# Altium footprint library HARTING THD.PcbLib: 113 footprints (part 8 of 11) (continued)
## HARTING_09 67 025 4755 [mm] "Straight D-Sub 25 Female Contacts with Turned Soder Contacts and Hole" (continued)
Mechanical 14:
  circle w0.1: c23.5,0 r1.55
  circle w0.1: c-23.5,0 r1.55
  lines w0.1: -26.6,-4.75 ccw(c-25.1,-4.75) -25.1,-6.25 25.1,-6.25 ccw(c25.1,-4.75) 26.6,-4.75 26.6,4.75 ccw(c25.1,4.75) 25.1,6.25 -25.1,6.25 ccw(c-25.1,4.75) -26.6,4.75 -26.6,-4.75 ; -19.215,0.949 cw(c-16.655,1.4) -16.655,4 16.655,4 cw(c16.655,1.4) 19.216,0.949 18.722,-1.851 cw(c16.161,-1.4) 16.161,-4 -16.161,-4 cw(c-16.161,-1.4) -18.722,-1.851 -19.215,0.949 ; -18.772,1.027 cw(c-16.655,1.4) -16.655,3.55 16.655,3.55 cw(c16.655,1.4) 18.772,1.027 18.279,-1.773 cw(c16.161,-1.4) 16.161,-3.55 -16.161,-3.55 cw(c-16.161,-1.4) -18.279,-1.773 -18.772,1.027
  text "14" at 18.5,-5.2 h1.2
  text "13" at -21,4 h1.2
  text "25" at -20,-5.2 h1.2
  text "1" at 20,4 h1.2
3D body "HARTING_09 67 025 4755.stp": height 12.3, standoff -5.7, extent -26.6,-6.25 26.6,6.25

## HARTING_09 67 025 4755_a [mm] "PCB Edge Mounting Footprint For Straight D-Sub 25 Female Contacts with Turned Soder Contacts and Hole"
height 12.3
pads (25):
  rect 1.8x4.5 smd paste-2.26: 1(-16.56,0) 2(-13.8,0) 3(-11.04,0) 4(-8.28,0) 5(-5.52,0) 6(-2.76,0) 7(0,0) 8(2.76,0) 9(5.52,0) 10(8.28,0) 11(11.04,0) 12(13.8,0) 13(16.56,0)
  rect 1.8x4.5 smd far side paste-2.26: 14(-15.18,0) 15(-12.42,0) 16(-9.66,0) 17(-6.9,0) 18(-4.14,0) 19(-1.38,0) 20(1.38,0) 21(4.14,0) 22(6.9,0) 23(9.66,0) 24(12.42,0) 25(15.18,0)
Top Overlay:
  lines w0.2: -20.162,8.928 -20.162,5.428 ccw(c-19.666,5.424) -19.67,4.928 19.67,4.928 ccw(c19.666,5.424) 20.162,5.428 20.162,8.928 ; -19.717,4.928 -19.717,3.928 -16.86,3.928 ; -19.215,10.028 -19.215,15.478 cw(c-18.769,15.481) -18.772,15.928 ; -18.805,15.928 18.723,15.928 cw(c18.766,15.48) 19.216,15.478 19.216,10.028 ; -16.86,2.65 -16.86,4.928 ; -16.26,2.65 -16.26,4.928 ; -16.26,3.928 -14.1,3.928 ; -15.48,2.65 -15.48,2.928 ; -15.48,3.428 -15.48,3.928 ; -14.88,2.65 -14.88,2.928 ; -14.88,3.428 -14.88,3.928 ; -14.1,2.65 -14.1,4.928 ; -13.5,2.65 -13.5,4.928 ; -13.5,3.928 -11.34,3.928 ; -12.72,2.65 -12.72,2.928 ; -12.72,3.428 -12.72,3.928 ; -12.12,2.65 -12.12,2.928 ; -12.12,3.428 -12.12,3.928 ; -11.34,2.65 -11.34,4.928 ; -10.74,2.65 -10.74,4.928 ; -10.74,3.928 -8.58,3.928 ; -9.96,2.65 -9.96,2.928 ; -9.96,3.428 -9.96,3.928 ; -9.36,2.65 -9.36,2.928 ; -9.36,3.428 -9.36,3.928 ; -8.58,2.65 -8.58,4.928 ; -7.98,2.65 -7.98,4.928 ; -7.98,3.928 -5.82,3.928 ; -7.2,2.65 -7.2,2.928 ; -7.2,3.428 -7.2,3.928 ; -6.6,2.65 -6.6,2.928 ; -6.6,3.428 -6.6,3.928 ; -5.82,2.65 -5.82,4.928 ; -5.22,2.65 -5.22,4.928 ; -5.22,3.928 -3.06,3.928 ; -4.44,2.65 -4.44,2.928 ; -4.44,3.428 -4.44,3.928 ; -3.84,2.65 -3.84,2.928 ; -3.84,3.428 -3.84,3.928 ; -3.06,2.65 -3.06,4.928 ; -2.46,2.65 -2.46,4.928 ; -2.46,3.928 -0.3,3.928 ; -1.68,2.65 -1.68,2.928 ; -1.68,3.428 -1.68,3.928 ; -1.08,2.65 -1.08,2.928 ; -1.08,3.428 -1.08,3.928 ; -0.3,2.65 -0.3,4.928 ; 0.3,2.65 0.3,4.928 ; 0.3,3.928 2.46,3.928 ; 1.08,2.65 1.08,2.928 ; 1.08,3.428 1.08,3.928 ; 1.68,2.65 1.68,2.928 ; 1.68,3.428 1.68,3.928 ; 2.46,2.65 2.46,4.928 ; 3.06,2.65 3.06,4.928 ; 3.06,3.928 5.22,3.928 ; 3.84,2.65 3.84,2.928 ; 3.84,3.428 3.84,3.928 ; 4.44,2.65 4.44,2.928 ; 4.44,3.428 4.44,3.928 ; 5.22,2.65 5.22,4.928 ; 5.82,2.65 5.82,4.928 ; 5.82,3.928 7.98,3.928 ; 6.6,2.65 6.6,2.928 ; 6.6,3.428 6.6,3.928 ; 7.2,2.65 7.2,2.928 ; 7.2,3.428 7.2,3.928 ; 7.98,2.65 7.98,4.928 ; 8.58,2.65 8.58,4.928 ; 8.58,3.928 10.74,3.928 ; 9.36,2.65 9.36,2.928 ; 9.36,3.428 9.36,3.928 ; 9.96,2.65 9.96,2.928 ; 9.96,3.428 9.96,3.928 ; 10.74,2.65 10.74,4.928 ; 11.34,2.65 11.34,4.928 ; 11.34,3.928 13.5,3.928 ; 12.12,2.65 12.12,2.928 ; 12.12,3.428 12.12,3.928 ; 12.72,2.65 12.72,2.928 ; 12.72,3.428 12.72,3.928 ; 13.5,2.65 13.5,4.928 ; 14.1,2.65 14.1,4.928 ; 14.1,3.928 16.26,3.928 ; 14.88,2.65 14.88,2.928 ; 14.88,3.428 14.88,3.928 ; 15.48,2.65 15.48,2.928 ; 15.48,3.428 15.48,3.928 ; 16.26,2.65 16.26,4.928 ; 16.86,2.65 16.86,4.928 ; 16.86,3.928 19.717,3.928 19.717,4.928 ; -26.6,10.028 -26.575,8.928 26.594,8.928 26.594,10.028 -26.6,10.028
  text "13" at 18.07,-2.3 h1.2
  text "1" at -18.47,-2.2 h1.2
Bottom Overlay:
  lines w0.2: -20.162,8.928 -20.162,5.428 ccw(c-19.666,5.424) -19.67,4.928 19.67,4.928 ccw(c19.666,5.424) 20.162,5.428 20.162,8.928 ; -19.717,4.928 -19.717,3.928 -15.48,3.928 ; -19.215,10.028 -19.215,15.478 cw(c-18.769,15.481) -18.772,15.928 ; -18.805,15.928 18.723,15.928 cw(c18.766,15.48) 19.216,15.478 19.216,10.028 ; -15.48,2.65 -15.48,4.928 ; -14.88,2.65 -14.88,4.928 ; -14.88,3.928 -12.72,3.928 ; -14.1,2.65 -14.1,2.928 ; -14.1,3.428 -14.1,3.928 ; -13.5,2.65 -13.5,2.928 ; -13.5,3.428 -13.5,3.928 ; -12.72,2.65 -12.72,4.928 ; -12.12,2.65 -12.12,4.928 ; -12.12,3.928 -9.96,3.928 ; -11.34,2.65 -11.34,2.928 ; -11.34,3.428 -11.34,3.928 ; -10.74,2.65 -10.74,2.928 ; -10.74,3.428 -10.74,3.928 ; -9.96,2.65 -9.96,4.928 ; -9.36,2.65 -9.36,4.928 ; -9.36,3.928 -7.2,3.928 ; -8.58,2.65 -8.58,2.928 ; -8.58,3.428 -8.58,3.928 ; -7.98,2.65 -7.98,2.928 ; -7.98,3.428 -7.98,3.928 ; -7.2,2.65 -7.2,4.928 ; -6.6,2.65 -6.6,4.928 ; -6.6,3.928 -4.44,3.928 ; -5.82,2.65 -5.82,2.928 ; -5.82,3.428 -5.82,3.928 ; -5.22,2.65 -5.22,2.928 ; -5.22,3.428 -5.22,3.928 ; -4.44,2.65 -4.44,4.928 ; -3.84,2.65 -3.84,4.928 ; -3.84,3.928 -1.68,3.928 ; -3.06,2.65 -3.06,2.928 ; -3.06,3.428 -3.06,3.928 ; -2.46,2.65 -2.46,2.928 ; -2.46,3.428 -2.46,3.928 ; -1.68,2.65 -1.68,4.928 ; -1.08,2.65 -1.08,4.928 ; -1.08,3.928 1.08,3.928 ; -0.3,2.65 -0.3,2.928 ; -0.3,3.428 -0.3,3.928 ; 0.3,2.65 0.3,2.928 ; 0.3,3.428 0.3,3.928 ; 1.08,2.65 1.08,4.928 ; 1.68,2.65 1.68,4.928 ; 1.68,3.928 3.84,3.928 ; 2.46,2.65 2.46,2.928 ; 2.46,3.428 2.46,3.928 ; 3.06,2.65 3.06,2.928 ; 3.06,3.428 3.06,3.928 ; 3.84,2.65 3.84,4.928 ; 4.44,2.65 4.44,4.928 ; 4.44,3.928 6.6,3.928 ; 5.22,2.65 5.22,2.928 ; 5.22,3.428 5.22,3.928 ; 5.82,2.65 5.82,2.928 ; 5.82,3.428 5.82,3.928 ; 6.6,2.65 6.6,4.928 ; 7.2,2.65 7.2,4.928 ; 7.2,3.928 9.36,3.928 ; 7.98,2.65 7.98,2.928 ; 7.98,3.428 7.98,3.928 ; 8.58,2.65 8.58,2.928 ; 8.58,3.428 8.58,3.928 ; 9.36,2.65 9.36,4.928 ; 9.96,2.65 9.96,4.928 ; 9.96,3.928 12.12,3.928 ; 10.74,2.65 10.74,2.928 ; 10.74,3.428 10.74,3.928 ; 11.34,2.65 11.34,2.928 ; 11.34,3.428 11.34,3.928 ; 12.12,2.65 12.12,4.928 ; 12.72,2.65 12.72,4.928 ; 12.72,3.928 14.88,3.928 ; 13.5,2.65 13.5,2.928 ; 13.5,3.428 13.5,3.928 ; 14.1,2.65 14.1,2.928 ; 14.1,3.428 14.1,3.928 ; 14.88,2.65 14.88,4.928 ; 15.48,2.65 15.48,4.928 ; 15.48,3.928 19.717,3.928 19.717,4.928 ; 16.26,2.65 16.26,2.928 ; 16.26,3.428 16.26,3.928 ; 16.86,2.65 16.86,2.928 ; 16.86,3.428 16.86,3.928 ; -26.6,10.028 -26.575,8.928 26.594,8.928 26.594,10.028 -26.6,10.028
  text "25" at 18.27,-2.2 h1.2
  text "14" at -16.57,-2.2 h1.2
Mechanical 8:
  lines w0.1: -24,9.478 -23.5,9.478 ; -23.5,8.978 -23.5,9.478 ; -23.5,9.978 -23.5,9.478 ; -23,9.478 -23.5,9.478 ; -17.06,0 -16.56,0 ; -16.56,-0.5 -16.56,0 ; -16.56,0.5 -16.56,0 ; -16.06,0 -16.56,0 ; -15.68,0 -15.18,0 ; -15.18,-0.5 -15.18,0 ; -15.18,0.5 -15.18,0 ; -14.68,0 -15.18,0 ; -14.3,0 -13.8,0 ; -13.8,-0.5 -13.8,0 ; -13.8,0.5 -13.8,0 ; -13.3,0 -13.8,0 ; -12.92,0 -12.42,0 ; -12.42,-0.5 -12.42,0 ; -12.42,0.5 -12.42,0 ; -11.92,0 -12.42,0 ; -11.54,0 -11.04,0 ; -11.04,-0.5 -11.04,0 ; -11.04,0.5 -11.04,0 ; -10.54,0 -11.04,0 ; -10.16,0 -9.66,0 ; -9.66,-0.5 -9.66,0 ; -9.66,0.5 -9.66,0 ; -9.16,0 -9.66,0 ; -8.78,0 -8.28,0 ; -8.28,-0.5 -8.28,0 ; -8.28,0.5 -8.28,0 ; -7.78,0 -8.28,0 ; -7.4,0 -6.9,0 ; -6.9,-0.5 -6.9,0 ; -6.9,0.5 -6.9,0 ; -6.4,0 -6.9,0 ; -6.02,0 -5.52,0 ; -5.52,-0.5 -5.52,0 ; -5.52,0.5 -5.52,0 ; -5.02,0 -5.52,0 ; -4.64,0 -4.14,0 ; -4.14,-0.5 -4.14,0 ; -4.14,0.5 -4.14,0 ; -3.64,0 -4.14,0 ; -3.26,0 -2.76,0 ; -2.76,-0.5 -2.76,0 ; -2.76,0.5 -2.76,0 ; -2.26,0 -2.76,0 ; -1.88,0 -1.38,0 ; -1.38,-0.5 -1.38,0 ; -1.38,0.5 -1.38,0 ; -0.88,0 -1.38,0 ; -0.5,0 0,0 ; 0,-0.5 0,0 ; 0,0.5 0,0 ; 0.5,0 0,0 ; 0.88,0 1.38,0 ; 1.38,-0.5 1.38,0 ; 1.38,0.5 1.38,0 ; 1.88,0 1.38,0 ; 2.26,0 2.76,0 ; 2.76,-0.5 2.76,0 ; 2.76,0.5 2.76,0 ; 3.26,0 2.76,0 ; 3.64,0 4.14,0 ; 4.14,-0.5 4.14,0 ; 4.14,0.5 4.14,0 ; 4.64,0 4.14,0 ; 5.02,0 5.52,0 ; 5.52,-0.5 5.52,0 ; 5.52,0.5 5.52,0 ; 6.02,0 5.52,0 ; 6.4,0 6.9,0 ; 6.9,-0.5 6.9,0 ; 6.9,0.5 6.9,0 ; 7.4,0 6.9,0 ; 7.78,0 8.28,0 ; 8.28,-0.5 8.28,0 ; 8.28,0.5 8.28,0 ; 8.78,0 8.28,0 ; 9.16,0 9.66,0 ; 9.66,-0.5 9.66,0 ; 9.66,0.5 9.66,0 ; 10.16,0 9.66,0 ; 10.54,0 11.04,0 ; 11.04,-0.5 11.04,0 ; 11.04,0.5 11.04,0 ; 11.54,0 11.04,0 ; 11.92,0 12.42,0 ; 12.42,-0.5 12.42,0 ; 12.42,0.5 12.42,0 ; 12.92,0 12.42,0 ; 13.3,0 13.8,0 ; 13.8,-0.5 13.8,0 ; 13.8,0.5 13.8,0 ; 14.3,0 13.8,0 ; 14.68,0 15.18,0 ; 15.18,-0.5 15.18,0 ; 15.18,0.5 15.18,0 ; 15.68,0 15.18,0 ; 16.06,0 16.56,0 ; 16.56,-0.5 16.56,0 ; 16.56,0.5 16.56,0 ; 17.06,0 16.56,0 ; 23,9.478 23.5,9.478 ; 23.5,8.978 23.5,9.478 ; 23.5,9.978 23.5,9.478 ; 24,9.478 23.5,9.478
Mechanical 14:
  drawing of 250 lines, arcs and shapes, not listed
  text "13" at 18.07,-2.3 h1.2
  text "1" at -18.47,-2.2 h1.2
3D body "HARTING_09 67 025 4755_a.stp": height 5.45, standoff -7.05, extent -26.6,-2.072 26.6,15.928

## HARTING_09 67 025 5655 [mm] "Straight D-Sub 25 Male Contacts with Turned Soder Contacts and Hole"
height 12.3
pads (27):
  round 1.7 hole 1: 1(-16.56,1.42) 2(-13.8,1.42) 3(-11.04,1.42) 4(-8.28,1.42) 5(-5.52,1.42) 6(-2.76,1.42) 7(0,1.42) 8(2.76,1.42) 9(5.52,1.42) 10(8.28,1.42) 11(11.04,1.42) 12(13.8,1.42) 13(16.56,1.42) 14(-15.18,-1.42) 15(-12.42,-1.42) 16(-9.66,-1.42) 17(-6.9,-1.42) 18(-4.14,-1.42) 19(-1.38,-1.42) 20(1.38,-1.42) 21(4.14,-1.42) 22(6.9,-1.42) 23(9.66,-1.42) 24(12.42,-1.42) 25(15.18,-1.42)
  round 5.5 hole 3.2: 26(23.5,0) 27(-23.5,0)
Top Overlay:
  circle w0.5: c-16.56,7.42 r0.25
  lines w0.2: -26.6,-4.75 ccw(c-25.1,-4.75) -25.1,-6.25 25.1,-6.25 ccw(c25.1,-4.75) 26.6,-4.75 26.6,4.75 ccw(c25.1,4.75) 25.1,6.25 -25.1,6.25 ccw(c-25.1,4.75) -26.6,4.75 -26.6,-4.75 ; -20.003,0.987 cw(c-16.95,1.525) -16.95,4.625 16.95,4.625 cw(c16.95,1.525) 20.003,0.987 19.465,-2.063 cw(c16.412,-1.525) 16.412,-4.625 -16.412,-4.625 cw(c-16.412,-1.525) -19.465,-2.063 -20.003,0.987 ; -19.511,1.074 cw(c-16.95,1.525) -16.95,4.125 16.95,4.125 cw(c16.95,1.525) 19.511,1.074 18.973,-1.976 cw(c16.412,-1.525) 16.412,-4.125 -16.412,-4.125 cw(c-16.412,-1.525) -18.973,-1.976 -19.511,1.074
  text "13" at 20.19,4.075 h1.2
  text "25" at 19.655,-5.2 h1.2
  text "1" at -21.12,4 h1.2
  text "14" at -21.86,-5.2 h1.2
Mechanical 8:
  lines w0.1: -24,0 -23.5,0 ; -23.5,-0.5 -23.5,0 ; -23.5,0.5 -23.5,0 ; -23,0 -23.5,0 ; -17.06,1.42 -16.56,1.42 ; -16.56,0.92 -16.56,1.42 ; -16.56,1.92 -16.56,1.42 ; -16.06,1.42 -16.56,1.42 ; -15.68,-1.42 -15.18,-1.42 ; -15.18,-1.92 -15.18,-1.42 ; -15.18,-0.92 -15.18,-1.42 ; -14.68,-1.42 -15.18,-1.42 ; -14.3,1.42 -13.8,1.42 ; -13.8,0.92 -13.8,1.42 ; -13.8,1.92 -13.8,1.42 ; -13.3,1.42 -13.8,1.42 ; -12.92,-1.42 -12.42,-1.42 ; -12.42,-1.92 -12.42,-1.42 ; -12.42,-0.92 -12.42,-1.42 ; -11.92,-1.42 -12.42,-1.42 ; -11.54,1.42 -11.04,1.42 ; -11.04,0.92 -11.04,1.42 ; -11.04,1.92 -11.04,1.42 ; -10.54,1.42 -11.04,1.42 ; -10.16,-1.42 -9.66,-1.42 ; -9.66,-1.92 -9.66,-1.42 ; -9.66,-0.92 -9.66,-1.42 ; -9.16,-1.42 -9.66,-1.42 ; -8.78,1.42 -8.28,1.42 ; -8.28,0.92 -8.28,1.42 ; -8.28,1.92 -8.28,1.42 ; -7.78,1.42 -8.28,1.42 ; -7.4,-1.42 -6.9,-1.42 ; -6.9,-1.92 -6.9,-1.42 ; -6.9,-0.92 -6.9,-1.42 ; -6.4,-1.42 -6.9,-1.42 ; -6.02,1.42 -5.52,1.42 ; -5.52,0.92 -5.52,1.42 ; -5.52,1.92 -5.52,1.42 ; -5.02,1.42 -5.52,1.42 ; -4.64,-1.42 -4.14,-1.42 ; -4.14,-1.92 -4.14,-1.42 ; -4.14,-0.92 -4.14,-1.42 ; -3.64,-1.42 -4.14,-1.42 ; -3.26,1.42 -2.76,1.42 ; -2.76,0.92 -2.76,1.42 ; -2.76,1.92 -2.76,1.42 ; -2.26,1.42 -2.76,1.42 ; -1.88,-1.42 -1.38,-1.42 ; -1.38,-1.92 -1.38,-1.42 ; -1.38,-0.92 -1.38,-1.42 ; -0.88,-1.42 -1.38,-1.42 ; -0.5,0 0,0 ; -0.5,1.42 0,1.42 ; 0,-0.5 0,0 ; 0,0.5 0,0 ; 0,0.92 0,1.42 ; 0,1.92 0,1.42 ; 0.5,0 0,0 ; 0.5,1.42 0,1.42 ; 0.88,-1.42 1.38,-1.42 ; 1.38,-1.92 1.38,-1.42 ; 1.38,-0.92 1.38,-1.42 ; 1.88,-1.42 1.38,-1.42 ; 2.26,1.42 2.76,1.42 ; 2.76,0.92 2.76,1.42 ; 2.76,1.92 2.76,1.42 ; 3.26,1.42 2.76,1.42 ; 3.64,-1.42 4.14,-1.42 ; 4.14,-1.92 4.14,-1.42 ; 4.14,-0.92 4.14,-1.42 ; 4.64,-1.42 4.14,-1.42 ; 5.02,1.42 5.52,1.42 ; 5.52,0.92 5.52,1.42 ; 5.52,1.92 5.52,1.42 ; 6.02,1.42 5.52,1.42 ; 6.4,-1.42 6.9,-1.42 ; 6.9,-1.92 6.9,-1.42 ; 6.9,-0.92 6.9,-1.42 ; 7.4,-1.42 6.9,-1.42 ; 7.78,1.42 8.28,1.42 ; 8.28,0.92 8.28,1.42 ; 8.28,1.92 8.28,1.42 ; 8.78,1.42 8.28,1.42 ; 9.16,-1.42 9.66,-1.42 ; 9.66,-1.92 9.66,-1.42 ; 9.66,-0.92 9.66,-1.42 ; 10.16,-1.42 9.66,-1.42 ; 10.54,1.42 11.04,1.42 ; 11.04,0.92 11.04,1.42 ; 11.04,1.92 11.04,1.42 ; 11.54,1.42 11.04,1.42 ; 11.92,-1.42 12.42,-1.42 ; 12.42,-1.92 12.42,-1.42 ; 12.42,-0.92 12.42,-1.42 ; 12.92,-1.42 12.42,-1.42 ; 13.3,1.42 13.8,1.42 ; 13.8,0.92 13.8,1.42 ; 13.8,1.92 13.8,1.42 ; 14.3,1.42 13.8,1.42 ; 14.68,-1.42 15.18,-1.42 ; 15.18,-1.92 15.18,-1.42 ; 15.18,-0.92 15.18,-1.42 ; 15.68,-1.42 15.18,-1.42 ; 16.06,1.42 16.56,1.42 ; 16.56,0.92 16.56,1.42 ; 16.56,1.92 16.56,1.42 ; 17.06,1.42 16.56,1.42 ; 23,0 23.5,0 ; 23.5,-0.5 23.5,0 ; 23.5,0.5 23.5,0 ; 24,0 23.5,0
Mechanical 14:
  circle w0.1: c-23.5,0 r1.55
  circle w0.1: c23.5,0 r1.55
  circle w0.1: c-16.56,1.42 r0.5
  circle w0.1: c-15.18,-1.42 r0.5
  circle w0.1: c-13.8,1.42 r0.5
  circle w0.1: c-12.42,-1.42 r0.5
  circle w0.1: c-11.04,1.42 r0.5
  circle w0.1: c-9.66,-1.42 r0.5
  circle w0.1: c-8.28,1.42 r0.5
  circle w0.1: c-6.9,-1.42 r0.5
  circle w0.1: c-5.52,1.42 r0.5
  circle w0.1: c-4.14,-1.42 r0.5
  circle w0.1: c-2.76,1.42 r0.5
  circle w0.1: c-1.38,-1.42 r0.5
  circle w0.1: c0,1.42 r0.5
  circle w0.1: c1.38,-1.42 r0.5
  circle w0.1: c2.76,1.42 r0.5
  circle w0.1: c4.14,-1.42 r0.5
  circle w0.1: c5.52,1.42 r0.5
  circle w0.1: c6.9,-1.42 r0.5
  circle w0.1: c8.28,1.42 r0.5
  circle w0.1: c9.66,-1.42 r0.5
  circle w0.1: c11.04,1.42 r0.5
  circle w0.1: c12.42,-1.42 r0.5
  circle w0.1: c13.8,1.42 r0.5
  circle w0.1: c15.18,-1.42 r0.5
  circle w0.1: c16.56,1.42 r0.5
  lines w0.1: -26.6,-4.75 ccw(c-25.1,-4.75) -25.1,-6.25 25.1,-6.25 ccw(c25.1,-4.75) 26.6,-4.75 26.6,4.75 ccw(c25.1,4.75) 25.1,6.25 -25.1,6.25 ccw(c-25.1,4.75) -26.6,4.75 -26.6,-4.75 ; -20.003,0.987 cw(c-16.95,1.525) -16.95,4.625 16.95,4.625 cw(c16.95,1.525) 20.003,0.987 19.465,-2.063 cw(c16.412,-1.525) 16.412,-4.625 -16.412,-4.625 cw(c-16.412,-1.525) -19.465,-2.063 -20.003,0.987 ; -19.511,1.074 cw(c-16.95,1.525) -16.95,4.125 16.95,4.125 cw(c16.95,1.525) 19.511,1.074 18.973,-1.976 cw(c16.412,-1.525) 16.412,-4.125 -16.412,-4.125 cw(c-16.412,-1.525) -18.973,-1.976 -19.511,1.074
  text "14" at -21.86,-5.2 h1.2
  text "1" at -21.12,4 h1.2
  text "25" at 19.655,-5.2 h1.2
  text "13" at 20.19,4.075 h1.2
3D body "HARTING_09 67 025 5655.stp": height 12.3, standoff -5.7, extent -26.6,-6.25 26.6,6.25

## HARTING_09 67 025 5655_a [mm] "PCB Edge Mounting Footprint For D-Sub 25 Male Contacts with Turned Soder Contacts and Hole"
height 12.3
pads (25):
  rect 1.8x4.5 smd paste-2.26: 1(16.56,0) 2(13.8,0) 3(11.04,0) 4(8.28,0) 5(5.52,0) 6(2.76,0) 7(0,0) 8(-2.76,0) 9(-5.52,0) 10(-8.28,0) 11(-11.04,0) 12(-13.8,0) 13(-16.56,0)
  rect 1.8x4.5 smd far side paste-2.26: 14(15.18,0) 15(12.42,0) 16(9.66,0) 17(6.9,0) 18(4.14,0) 19(1.38,0) 20(-1.38,0) 21(-4.14,0) 22(-6.9,0) 23(-9.66,0) 24(-12.42,0) 25(-15.18,0)
Top Overlay:
  lines w0.2: -20.162,8.928 -20.162,5.428 ccw(c-19.666,5.424) -19.67,4.928 19.67,4.928 ccw(c19.666,5.424) 20.162,5.428 20.162,8.928 ; -19.717,4.928 -19.717,3.928 -16.86,3.928 ; -19.215,10.028 -19.215,15.478 cw(c-18.769,15.481) -18.772,15.928 ; -18.805,15.928 18.723,15.928 cw(c18.766,15.48) 19.216,15.478 19.216,10.028 ; -16.86,2.65 -16.86,4.928 ; -16.26,2.65 -16.26,4.928 ; -16.26,3.928 -14.1,3.928 ; -15.48,2.65 -15.48,2.928 ; -15.48,3.428 -15.48,3.928 ; -14.88,2.65 -14.88,2.928 ; -14.88,3.428 -14.88,3.928 ; -14.1,2.65 -14.1,4.928 ; -13.5,2.65 -13.5,4.928 ; -13.5,3.928 -11.34,3.928 ; -12.72,2.65 -12.72,2.928 ; -12.72,3.428 -12.72,3.928 ; -12.12,2.65 -12.12,2.928 ; -12.12,3.428 -12.12,3.928 ; -11.34,2.65 -11.34,4.928 ; -10.74,2.65 -10.74,4.928 ; -10.74,3.928 -8.58,3.928 ; -9.96,2.65 -9.96,2.928 ; -9.96,3.428 -9.96,3.928 ; -9.36,2.65 -9.36,2.928 ; -9.36,3.428 -9.36,3.928 ; -8.58,2.65 -8.58,4.928 ; -7.98,2.65 -7.98,4.928 ; -7.98,3.928 -5.82,3.928 ; -7.2,2.65 -7.2,2.928 ; -7.2,3.428 -7.2,3.928 ; -6.6,2.65 -6.6,2.928 ; -6.6,3.428 -6.6,3.928 ; -5.82,2.65 -5.82,4.928 ; -5.22,2.65 -5.22,4.928 ; -5.22,3.928 -3.06,3.928 ; -4.44,2.65 -4.44,2.928 ; -4.44,3.428 -4.44,3.928 ; -3.84,2.65 -3.84,2.928 ; -3.84,3.428 -3.84,3.928 ; -3.06,2.65 -3.06,4.928 ; -2.46,2.65 -2.46,4.928 ; -2.46,3.928 -0.3,3.928 ; -1.68,2.65 -1.68,2.928 ; -1.68,3.428 -1.68,3.928 ; -1.08,2.65 -1.08,2.928 ; -1.08,3.428 -1.08,3.928 ; -0.3,2.65 -0.3,4.928 ; 0.3,2.65 0.3,4.928 ; 0.3,3.928 2.46,3.928 ; 1.08,2.65 1.08,2.928 ; 1.08,3.428 1.08,3.928 ; 1.68,2.65 1.68,2.928 ; 1.68,3.428 1.68,3.928 ; 2.46,2.65 2.46,4.928 ; 3.06,2.65 3.06,4.928 ; 3.06,3.928 5.22,3.928 ; 3.84,2.65 3.84,2.928 ; 3.84,3.428 3.84,3.928 ; 4.44,2.65 4.44,2.928 ; 4.44,3.428 4.44,3.928 ; 5.22,2.65 5.22,4.928 ; 5.82,2.65 5.82,4.928 ; 5.82,3.928 7.98,3.928 ; 6.6,2.65 6.6,2.928 ; 6.6,3.428 6.6,3.928 ; 7.2,2.65 7.2,2.928 ; 7.2,3.428 7.2,3.928 ; 7.98,2.65 7.98,4.928 ; 8.58,2.65 8.58,4.928 ; 8.58,3.928 10.74,3.928 ; 9.36,2.65 9.36,2.928 ; 9.36,3.428 9.36,3.928 ; 9.96,2.65 9.96,2.928 ; 9.96,3.428 9.96,3.928 ; 10.74,2.65 10.74,4.928 ; 11.34,2.65 11.34,4.928 ; 11.34,3.928 13.5,3.928 ; 12.12,2.65 12.12,2.928 ; 12.12,3.428 12.12,3.928 ; 12.72,2.65 12.72,2.928 ; 12.72,3.428 12.72,3.928 ; 13.5,2.65 13.5,4.928 ; 14.1,2.65 14.1,4.928 ; 14.1,3.928 16.26,3.928 ; 14.88,2.65 14.88,2.928 ; 14.88,3.428 14.88,3.928 ; 15.48,2.65 15.48,2.928 ; 15.48,3.428 15.48,3.928 ; 16.26,2.65 16.26,4.928 ; 16.86,2.65 16.86,4.928 ; 16.86,3.928 19.717,3.928 19.717,4.928 ; -26.6,10.028 26.594,10.028 26.594,8.928 -26.575,8.928 -26.6,10.028
  text "13" at -18.47,-2.2 h1.2
  text "1" at 18.07,-2.3 h1.2
Bottom Overlay:
  lines w0.2: -20.162,8.928 -20.162,5.428 ccw(c-19.666,5.424) -19.67,4.928 19.67,4.928 ccw(c19.666,5.424) 20.162,5.428 20.162,8.928 ; -19.717,4.928 -19.717,3.928 -15.48,3.928 ; -19.215,10.028 -19.215,15.478 cw(c-18.769,15.481) -18.772,15.928 ; -18.805,15.928 18.723,15.928 cw(c18.766,15.48) 19.216,15.478 19.216,10.028 ; -15.48,2.65 -15.48,4.928 ; -14.88,2.65 -14.88,4.928 ; -14.88,3.928 -12.72,3.928 ; -14.1,2.65 -14.1,2.928 ; -14.1,3.428 -14.1,3.928 ; -13.5,2.65 -13.5,2.928 ; -13.5,3.428 -13.5,3.928 ; -12.72,2.65 -12.72,4.928 ; -12.12,2.65 -12.12,4.928 ; -12.12,3.928 -9.96,3.928 ; -11.34,2.65 -11.34,2.928 ; -11.34,3.428 -11.34,3.928 ; -10.74,2.65 -10.74,2.928 ; -10.74,3.428 -10.74,3.928 ; -9.96,2.65 -9.96,4.928 ; -9.36,2.65 -9.36,4.928 ; -9.36,3.928 -7.2,3.928 ; -8.58,2.65 -8.58,2.928 ; -8.58,3.428 -8.58,3.928 ; -7.98,2.65 -7.98,2.928 ; -7.98,3.428 -7.98,3.928 ; -7.2,2.65 -7.2,4.928 ; -6.6,2.65 -6.6,4.928 ; -6.6,3.928 -4.44,3.928 ; -5.82,2.65 -5.82,2.928 ; -5.82,3.428 -5.82,3.928 ; -5.22,2.65 -5.22,2.928 ; -5.22,3.428 -5.22,3.928 ; -4.44,2.65 -4.44,4.928 ; -3.84,2.65 -3.84,4.928 ; -3.84,3.928 -1.68,3.928 ; -3.06,2.65 -3.06,2.928 ; -3.06,3.428 -3.06,3.928 ; -2.46,2.65 -2.46,2.928 ; -2.46,3.428 -2.46,3.928 ; -1.68,2.65 -1.68,4.928 ; -1.08,2.65 -1.08,4.928 ; -1.08,3.928 1.08,3.928 ; -0.3,2.65 -0.3,2.928 ; -0.3,3.428 -0.3,3.928 ; 0.3,2.65 0.3,2.928 ; 0.3,3.428 0.3,3.928 ; 1.08,2.65 1.08,4.928 ; 1.68,2.65 1.68,4.928 ; 1.68,3.928 3.84,3.928 ; 2.46,2.65 2.46,2.928 ; 2.46,3.428 2.46,3.928 ; 3.06,2.65 3.06,2.928 ; 3.06,3.428 3.06,3.928 ; 3.84,2.65 3.84,4.928 ; 4.44,2.65 4.44,4.928 ; 4.44,3.928 6.6,3.928 ; 5.22,2.65 5.22,2.928 ; 5.22,3.428 5.22,3.928 ; 5.82,2.65 5.82,2.928 ; 5.82,3.428 5.82,3.928 ; 6.6,2.65 6.6,4.928 ; 7.2,2.65 7.2,4.928 ; 7.2,3.928 9.36,3.928 ; 7.98,2.65 7.98,2.928 ; 7.98,3.428 7.98,3.928 ; 8.58,2.65 8.58,2.928 ; 8.58,3.428 8.58,3.928 ; 9.36,2.65 9.36,4.928 ; 9.96,2.65 9.96,4.928 ; 9.96,3.928 12.12,3.928 ; 10.74,2.65 10.74,2.928 ; 10.74,3.428 10.74,3.928 ; 11.34,2.65 11.34,2.928 ; 11.34,3.428 11.34,3.928 ; 12.12,2.65 12.12,4.928 ; 12.72,2.65 12.72,4.928 ; 12.72,3.928 14.88,3.928 ; 13.5,2.65 13.5,2.928 ; 13.5,3.428 13.5,3.928 ; 14.1,2.65 14.1,2.928 ; 14.1,3.428 14.1,3.928 ; 14.88,2.65 14.88,4.928 ; 15.48,2.65 15.48,4.928 ; 15.48,3.928 19.717,3.928 19.717,4.928 ; 16.26,2.65 16.26,2.928 ; 16.26,3.428 16.26,3.928 ; 16.86,2.65 16.86,2.928 ; 16.86,3.428 16.86,3.928 ; -26.6,10.028 26.594,10.028 26.594,8.928 -26.575,8.928 -26.6,10.028
  text "25" at -16.57,-2.2 h1.2
  text "14" at 18.27,-2.2 h1.2
Mechanical 8:
  lines w0.1: -24,9.478 -23.5,9.478 ; -23.5,8.978 -23.5,9.478 ; -23.5,9.978 -23.5,9.478 ; -23,9.478 -23.5,9.478 ; -17.06,0 -16.56,0 ; -16.56,-0.5 -16.56,0 ; -16.56,0.5 -16.56,0 ; -16.06,0 -16.56,0 ; -15.68,0 -15.18,0 ; -15.18,-0.5 -15.18,0 ; -15.18,0.5 -15.18,0 ; -14.68,0 -15.18,0 ; -14.3,0 -13.8,0 ; -13.8,-0.5 -13.8,0 ; -13.8,0.5 -13.8,0 ; -13.3,0 -13.8,0 ; -12.92,0 -12.42,0 ; -12.42,-0.5 -12.42,0 ; -12.42,0.5 -12.42,0 ; -11.92,0 -12.42,0 ; -11.54,0 -11.04,0 ; -11.04,-0.5 -11.04,0 ; -11.04,0.5 -11.04,0 ; -10.54,0 -11.04,0 ; -10.16,0 -9.66,0 ; -9.66,-0.5 -9.66,0 ; -9.66,0.5 -9.66,0 ; -9.16,0 -9.66,0 ; -8.78,0 -8.28,0 ; -8.28,-0.5 -8.28,0 ; -8.28,0.5 -8.28,0 ; -7.78,0 -8.28,0 ; -7.4,0 -6.9,0 ; -6.9,-0.5 -6.9,0 ; -6.9,0.5 -6.9,0 ; -6.4,0 -6.9,0 ; -6.02,0 -5.52,0 ; -5.52,-0.5 -5.52,0 ; -5.52,0.5 -5.52,0 ; -5.02,0 -5.52,0 ; -4.64,0 -4.14,0 ; -4.14,-0.5 -4.14,0 ; -4.14,0.5 -4.14,0 ; -3.64,0 -4.14,0 ; -3.26,0 -2.76,0 ; -2.76,-0.5 -2.76,0 ; -2.76,0.5 -2.76,0 ; -2.26,0 -2.76,0 ; -1.88,0 -1.38,0 ; -1.38,-0.5 -1.38,0 ; -1.38,0.5 -1.38,0 ; -0.88,0 -1.38,0 ; -0.5,0 0,0 ; 0,-0.5 0,0 ; 0,0.5 0,0 ; 0.5,0 0,0 ; 0.88,0 1.38,0 ; 1.38,-0.5 1.38,0 ; 1.38,0.5 1.38,0 ; 1.88,0 1.38,0 ; 2.26,0 2.76,0 ; 2.76,-0.5 2.76,0 ; 2.76,0.5 2.76,0 ; 3.26,0 2.76,0 ; 3.64,0 4.14,0 ; 4.14,-0.5 4.14,0 ; 4.14,0.5 4.14,0 ; 4.64,0 4.14,0 ; 5.02,0 5.52,0 ; 5.52,-0.5 5.52,0 ; 5.52,0.5 5.52,0 ; 6.02,0 5.52,0 ; 6.4,0 6.9,0 ; 6.9,-0.5 6.9,0 ; 6.9,0.5 6.9,0 ; 7.4,0 6.9,0 ; 7.78,0 8.28,0 ; 8.28,-0.5 8.28,0 ; 8.28,0.5 8.28,0 ; 8.78,0 8.28,0 ; 9.16,0 9.66,0 ; 9.66,-0.5 9.66,0 ; 9.66,0.5 9.66,0 ; 10.16,0 9.66,0 ; 10.54,0 11.04,0 ; 11.04,-0.5 11.04,0 ; 11.04,0.5 11.04,0 ; 11.54,0 11.04,0 ; 11.92,0 12.42,0 ; 12.42,-0.5 12.42,0 ; 12.42,0.5 12.42,0 ; 12.92,0 12.42,0 ; 13.3,0 13.8,0 ; 13.8,-0.5 13.8,0 ; 13.8,0.5 13.8,0 ; 14.3,0 13.8,0 ; 14.68,0 15.18,0 ; 15.18,-0.5 15.18,0 ; 15.18,0.5 15.18,0 ; 15.68,0 15.18,0 ; 16.06,0 16.56,0 ; 16.56,-0.5 16.56,0 ; 16.56,0.5 16.56,0 ; 17.06,0 16.56,0 ; 23,9.478 23.5,9.478 ; 23.5,8.978 23.5,9.478 ; 23.5,9.978 23.5,9.478 ; 24,9.478 23.5,9.478
Mechanical 14:
  drawing of 250 lines, arcs and shapes, not listed
  text "1" at -18.47,-2.2 h1.2
  text "1" at 18.07,-2.3 h1.2
3D body "HARTING_09 67 025 5655_a.stp": height 5.45, standoff -7.05, extent -26.6,-2.072 26.6,15.928